# Altium footprint library DIP Component.PcbLib: 327 footprints (part 5 of 21)
Each footprint in its own frame and in the unit in brackets; x right, y up, seen from the top. Pads: shape width x height; smd on the part's side, far side on the other; paste and mask are expansions set on the pad; w line width, h text height; cw(c..) or ccw(c..) is an arc to the next point about the centre after c.
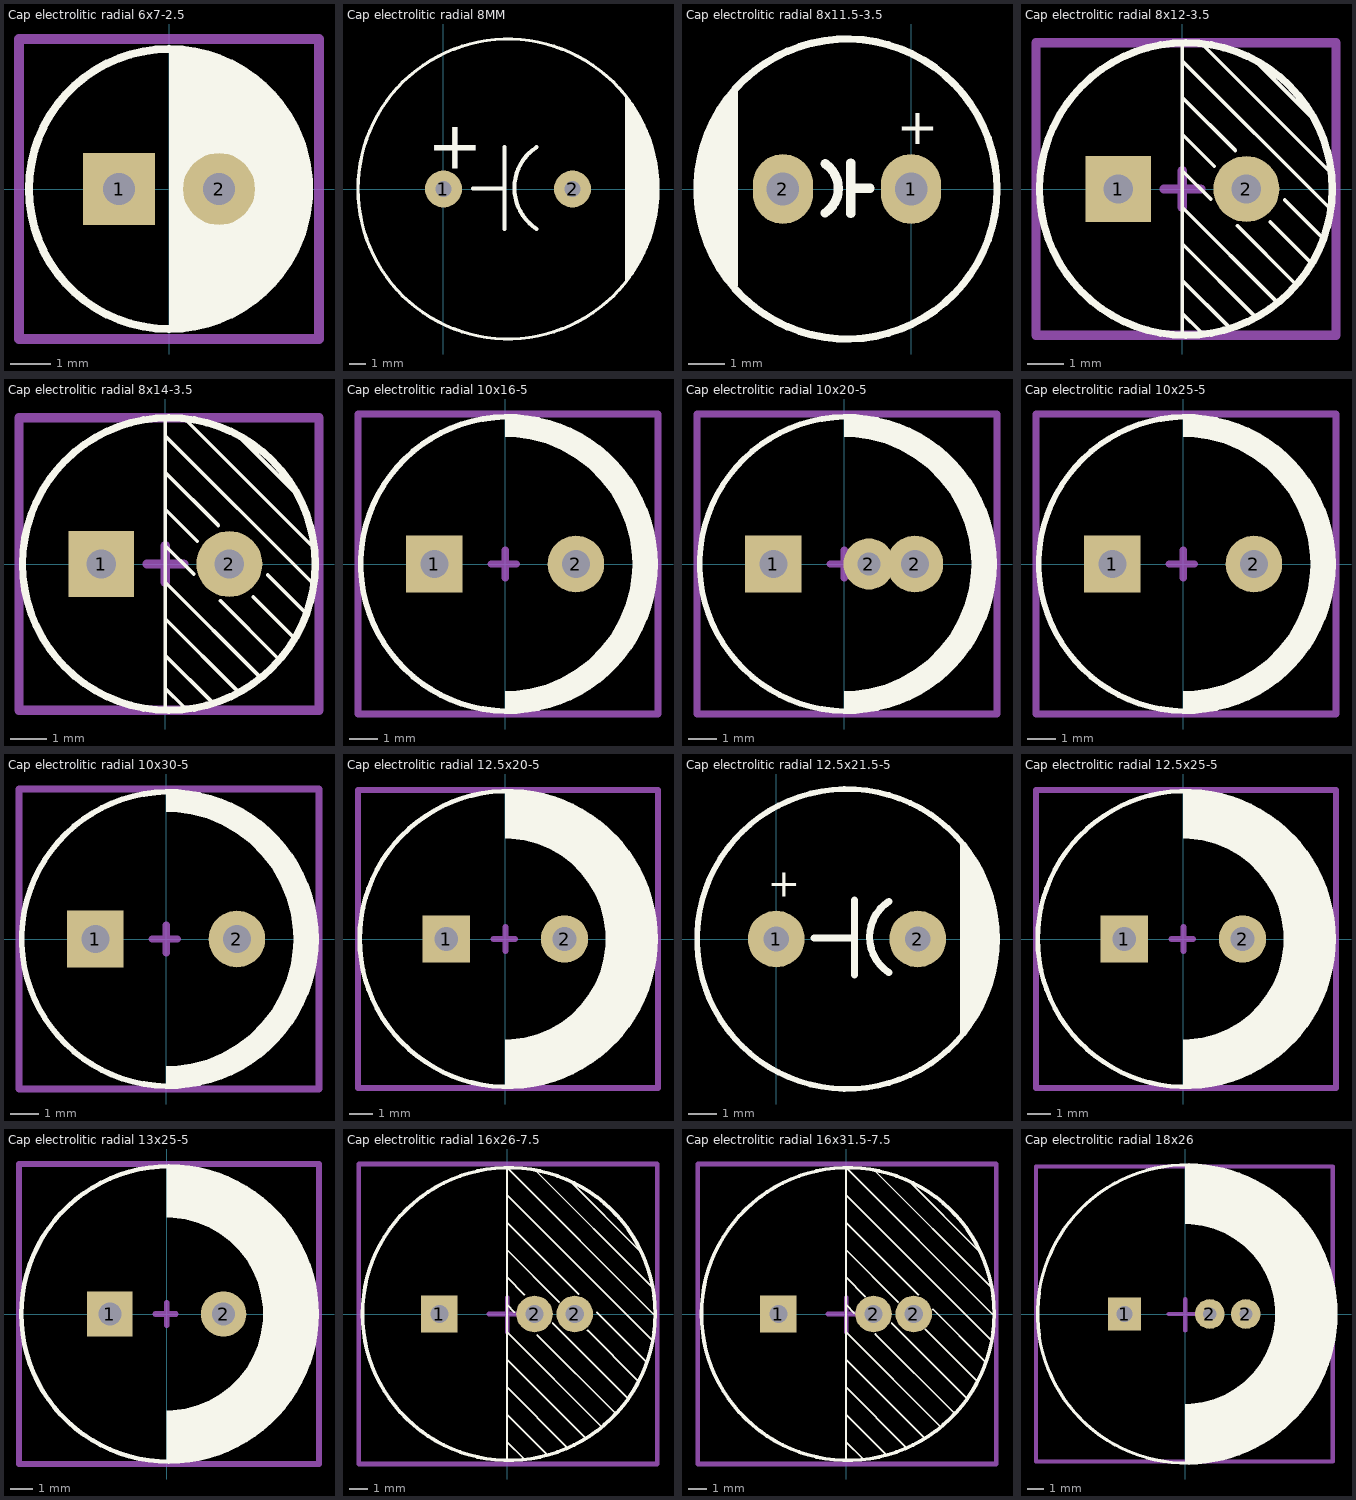
[diagram p4: the footprints below, top view; thin cyan lines are the x and y axes]

## Cap electrolitic radial 6x7-2.5 [mm] "Cap electrolitic radial 6x7-2.5-Design:Abbas Basereh"
height 7
pads (2):
  rect 1.8x1.8 hole 0.8: 1(-1.25,0)
  round 1.8 hole 0.8: 2(1.25,0)
Top Overlay:
  circle w0.2: c0,0 r3.5
  region: 0,3.5 0.096,3.5 0.325,3.5 0.78,3.44 1.223,3.321 1.647,3.146 2.045,2.916 2.409,2.637 2.733,2.313 3.012,1.949 3.242,1.551 3.417,1.127 3.536,0.684 3.596,0.229 3.596,0 3.596,-0.229 3.536,-0.684 3.417,-1.127 3.242,-1.551 3.012,-1.949 2.733,-2.313 2.409,-2.637 2.045,-2.916 1.647,-3.146 1.223,-3.321 0.78,-3.44 0.325,-3.5 0.096,-3.5 0,-3.5
Mechanical 15:
  lines w0.254: -3.75,-3.75 3.75,-3.75 3.75,3.75 -3.75,3.75 -3.75,-3.75
3D body "User Library-Cap electrolitic radial 6x7.STEP": height 7.3, standoff -1.2, extent -2.999,-2.999 2.999,2.998

## Cap electrolitic radial 8MM [mil] "Cap electrolitic radial 8MM-Design:Ali Hafizi"
pads (2):
  round 90 hole 39.37: 1(0,0) 2(314.96,0)
Top Overlay:
  circle w7.87: c157.48,0 r366.14
  lines w7.87: 446.46,-223.23 446.46,223.23 ; 453.54,-212.6 453.54,212.6 ; 460.63,-205.51 460.63,205.51 ; 467.72,-191.34 467.72,194.88 ; 474.8,-180.71 474.8,180.71 ; 481.89,-170.08 481.89,166.54 ; 488.98,-155.91 488.98,155.91 ; 496.06,-138.19 496.06,138.19 ; 503.15,-120.47 503.15,120.47 ; 510.24,-95.67 510.24,95.67 ; 517.32,-67.32 517.32,67.32
  lines w10: 72.44,1.57 148.82,1.57 ; 148.82,-97.64 148.82,102.36 ; 226.77,-97.24 cw(c292.4,2.29) 227.37,102.22
  text "+" at -39.37,49.61 h118.11

## Cap electrolitic radial 8x11.5-3.5 [mil] "Cap electrolitic radial 8x11.5-3.5-Design:Ali Hafizi"
pads (2):
  oval 65x75 hole 35: 1(0,0) 2(-137.8,0)
Top Overlay:
  circle w7.87: c-68.9,0 r161.42
  lines w7.87: -222.56,-42.13 -222.56,43.7
  lines w10: -215.08,-64.17 -215.08,63.78 ; -206.42,-81.89 -206.42,81.5 ; -197.76,-94.88 -197.76,95.28 ; -191.06,-103.15 -191.06,103.94 ; -92.54,-25.8 ccw(c-109.77,0.68) -92.38,27.05 ; -64.96,-26.38 -64.96,27.95 ; -64.96,0.79 -44.09,0.79
  text "+" at -15.35,48.03 h39.37
3D body "SW3dPS-Cap electro 8x11.5x3.5mm_V2008.STEP": height 473.44, standoff -136.91, extent -228.38,-159 88.58,157.96

## Cap electrolitic radial 8x12-3.5 [mm] "Cap electrolitic radial 8x12-3.5-Design:Abbas Basereh"
height 12
pads (2):
  rect 1.8x1.8 hole 0.8: 1(-1.75,0)
  round 1.8 hole 0.8: 2(1.75,0)
Top Overlay:
  circle w0.2: c0.096,0 r4
  lines w0.1: 0,-4 0,4 ; 0,-3.4 0.5,-3.9 ; 0,-2.5 1.3,-3.8 ; 0,-1.5 2,-3.5 ; 0,-0.5 2.6,-3.1 ; 0,0.5 0.775,-0.275 ; 0,1.5 0.875,0.625 ; 0,2.5 1.45,1.05 ; 0,3.5 4,-0.5 ; 0.5,4 4,0.5 ; 1.5,-1 3.1,-2.6 ; 2,3.5 3.6,1.9 ; 2.4,-0.9 3.5,-2 ; 2.8,-0.3 3.8,-1.3
Mechanical 15:
  lines w0.254: -0.5,0 0.5,0 ; 0,-0.5 0,0.5 ; -4,-4 -4,4 4.2,4 4.2,-4 -4,-4
3D body "User Library-Cap-EL(8x12-3_5)T.STEP": height 12.3, standoff -3.3, extent -4,-3.998 4.002,3.998

## Cap electrolitic radial 8x14-3.5 [mm] "Cap electrolitic radial 8x14-3.5-Design:Abbas Basereh"
height 14
pads (2):
  rect 1.8x1.8 hole 0.8: 1(-1.75,0)
  round 1.8 hole 0.8: 2(1.75,0)
Top Overlay:
  circle w0.2: c0.096,0 r4
  lines w0.1: 0,-4 0,4 ; 0,-3.4 0.5,-3.9 ; 0,-2.5 1.3,-3.8 ; 0,-1.5 2,-3.5 ; 0,-0.5 2.6,-3.1 ; 0,0.5 0.775,-0.275 ; 0,1.5 0.875,0.625 ; 0,2.5 1.45,1.05 ; 0,3.5 4,-0.5 ; 0.5,4 4,0.5 ; 1.5,-1 3.1,-2.6 ; 2,3.5 3.6,1.9 ; 2.4,-0.9 3.5,-2 ; 2.8,-0.3 3.8,-1.3
Mechanical 15:
  lines w0.254: -0.5,0 0.5,0 ; 0,-0.5 0,0.5 ; -4,-4 4.2,-4 4.2,4 -4,4 -4,-4
3D body "User Library-CAP-EL8X14_R150_D320_H570.STEP": height 14.6, standoff -2.7, extent -4.1,-4.1 4.1,4.1

## Cap electrolitic radial 10x16-5 [mm] "Cap electrolitic radial 10x16-5-Design:Abbas Basereh"
height 16
pads (2):
  rect 2x2 hole 1: 1(-2.5,0)
  round 2 hole 1: 2(2.5,0)
Top Overlay:
  circle w0.2: c0.096,0 r5.2
  region: 0,5.2 0.096,5.2 0.437,5.2 1.113,5.111 1.771,4.935 2.401,4.674 2.991,4.333 3.532,3.918 4.014,3.436 4.429,2.895 4.77,2.305 5.031,1.675 5.207,1.017 5.296,0.341 5.296,0 5.296,-0.341 5.207,-1.017 5.031,-1.675 4.77,-2.305 4.429,-2.895 4.014,-3.436 3.532,-3.918 2.991,-4.333 2.401,-4.674 1.771,-4.935 1.113,-5.111 0.437,-5.2 0.096,-5.2 0,-5.2 0,-4.5 0.294,-4.49 0.878,-4.414 1.446,-4.261 1.99,-4.036 2.5,-3.742 2.967,-3.383 3.383,-2.967 3.742,-2.5 4.036,-1.99 4.261,-1.446 4.414,-0.878 4.49,-0.294 4.5,0 4.49,0.294 4.414,0.878 4.261,1.446 4.036,1.99 3.742,2.5 3.383,2.967 2.967,3.383 2.5,3.742 1.99,4.036 1.446,4.261 0.878,4.414 0.294,4.49 0,4.5
Mechanical 15:
  lines w0.254: -0.5,0 0.4,0 ; 0,-0.5 0,0.5 ; -5.2,-5.3 -5.2,5.3 5.4,5.3 5.4,-5.3 -5.2,-5.3
3D body "User Library-Cap-EL(10x16-5).STEP": height 16, standoff -3.3, extent -5,-4.997 5.002,4.998

## Cap electrolitic radial 10x20-5 [mm] "Cap electrolitic radial 10x20-5-Design:Abbas Basereh"
height 20
pads (3):
  rect 2x2 hole 1: 1(-2.5,0)
  round 1.8 hole 0.8: 2(0.875,0)
  round 2 hole 1: 2(2.5,0)
Top Overlay:
  circle w0.2: c0.096,0 r5.2
  region: 0,5.2 0.096,5.2 0.437,5.2 1.113,5.111 1.771,4.935 2.401,4.674 2.991,4.333 3.532,3.918 4.014,3.436 4.429,2.895 4.77,2.305 5.031,1.675 5.207,1.017 5.296,0.341 5.296,0 5.296,-0.341 5.207,-1.017 5.031,-1.675 4.77,-2.305 4.429,-2.895 4.014,-3.436 3.532,-3.918 2.991,-4.333 2.401,-4.674 1.771,-4.935 1.113,-5.111 0.437,-5.2 0.096,-5.2 0,-5.2 0,-4.5 0.294,-4.49 0.878,-4.414 1.446,-4.261 1.99,-4.036 2.5,-3.742 2.967,-3.383 3.383,-2.967 3.742,-2.5 4.036,-1.99 4.261,-1.446 4.414,-0.878 4.49,-0.294 4.5,0 4.49,0.294 4.414,0.878 4.261,1.446 4.036,1.99 3.742,2.5 3.383,2.967 2.967,3.383 2.5,3.742 1.99,4.036 1.446,4.261 0.878,4.414 0.294,4.49 0,4.5
Mechanical 15:
  lines w0.254: -0.5,0 0.4,0 ; 0,-0.5 0,0.5 ; -5.2,-5.3 -5.2,5.3 5.4,5.3 5.4,-5.3 -5.2,-5.3
3D body "User Library-Cap-EL(10x20-5).STEP": height 20, standoff -3.3, extent -5,-5 5.002,5

## Cap electrolitic radial 10x25-5 [mm] "Cap electrolitic radial 10x25-5-Design:Abbas Basereh"
height 25
pads (2):
  rect 2x2 hole 1: 1(-2.5,0)
  round 2 hole 1: 2(2.5,0)
Top Overlay:
  circle w0.2: c0.096,0 r5.2
  region: 0,5.2 0.096,5.2 0.437,5.2 1.113,5.111 1.771,4.935 2.401,4.674 2.991,4.333 3.532,3.918 4.014,3.436 4.429,2.895 4.77,2.305 5.031,1.675 5.207,1.017 5.296,0.341 5.296,0 5.296,-0.341 5.207,-1.017 5.031,-1.675 4.77,-2.305 4.429,-2.895 4.014,-3.436 3.532,-3.918 2.991,-4.333 2.401,-4.674 1.771,-4.935 1.113,-5.111 0.437,-5.2 0.096,-5.2 0,-5.2 0,-4.5 0.294,-4.49 0.878,-4.414 1.446,-4.261 1.99,-4.036 2.5,-3.742 2.967,-3.383 3.383,-2.967 3.742,-2.5 4.036,-1.99 4.261,-1.446 4.414,-0.878 4.49,-0.294 4.5,0 4.49,0.294 4.414,0.878 4.261,1.446 4.036,1.99 3.742,2.5 3.383,2.967 2.967,3.383 2.5,3.742 1.99,4.036 1.446,4.261 0.878,4.414 0.294,4.49 0,4.5
Mechanical 15:
  lines w0.254: -0.5,0 0.4,0 ; 0,-0.5 0,0.5 ; -5.2,-5.3 5.4,-5.3 5.4,5.3 -5.2,5.3 -5.2,-5.3
3D body "User Library-Cap-EL(10x25-5).STEP": height 25, standoff -3.3, extent -5,-4.998 5.002,4.999

## Cap electrolitic radial 10x30-5 [mm] "Cap electrolitic radial 10x30-5-Design:Abbas Basereh"
height 30
pads (2):
  rect 2x2 hole 1: 1(-2.5,0)
  round 2 hole 1: 2(2.5,0)
Top Overlay:
  circle w0.2: c0.096,0 r5.2
  region: 0,5.2 0.096,5.2 0.437,5.2 1.113,5.111 1.771,4.935 2.401,4.674 2.991,4.333 3.532,3.918 4.014,3.436 4.429,2.895 4.77,2.305 5.031,1.675 5.207,1.017 5.296,0.341 5.296,0 5.296,-0.341 5.207,-1.017 5.031,-1.675 4.77,-2.305 4.429,-2.895 4.014,-3.436 3.532,-3.918 2.991,-4.333 2.401,-4.674 1.771,-4.935 1.113,-5.111 0.437,-5.2 0.096,-5.2 0,-5.2 0,-4.5 0.294,-4.49 0.878,-4.414 1.446,-4.261 1.99,-4.036 2.5,-3.742 2.967,-3.383 3.383,-2.967 3.742,-2.5 4.036,-1.99 4.261,-1.446 4.414,-0.878 4.49,-0.294 4.5,0 4.49,0.294 4.414,0.878 4.261,1.446 4.036,1.99 3.742,2.5 3.383,2.967 2.967,3.383 2.5,3.742 1.99,4.036 1.446,4.261 0.878,4.414 0.294,4.49 0,4.5
Mechanical 15:
  lines w0.254: -0.5,0 0.4,0 ; 0,-0.5 0,0.5 ; -5.2,-5.3 5.4,-5.3 5.4,5.3 -5.2,5.3 -5.2,-5.3
3D body "User Library-Cap-EL(10x30-5)T.STEP": height 30.5, standoff -3.5, extent -5,-4.997 5.002,4.996

## Cap electrolitic radial 12.5x20-5 [mm] "Cap electrolitic radial 12.5x20-5-Design:Abbas Basereh"
height 20
pads (2):
  rect 2x2 hole 1: 1(-2.5,0)
  round 2 hole 1: 2(2.5,0)
Top Overlay:
  circle w0.2: c0.096,0 r6.25
  region: 0,6.25 0.307,6.25 0.918,6.19 1.52,6.07 2.108,5.892 2.675,5.657 3.217,5.367 3.728,5.026 4.202,4.637 4.637,4.202 5.026,3.728 5.367,3.217 5.657,2.675 5.892,2.108 6.07,1.52 6.19,0.918 6.25,0.307 6.25,0 6.25,-0.307 6.19,-0.918 6.07,-1.52 5.892,-2.108 5.657,-2.675 5.367,-3.217 5.026,-3.728 4.637,-4.202 4.202,-4.637 3.728,-5.026 3.217,-5.367 2.675,-5.657 2.108,-5.892 1.52,-6.07 0.918,-6.19 0.307,-6.25 0,-6.25 0,-4.25 0.278,-4.241 0.829,-4.168 1.366,-4.024 1.88,-3.812 2.361,-3.534 2.802,-3.195 3.195,-2.802 3.534,-2.361 3.812,-1.88 4.024,-1.366 4.168,-0.829 4.241,-0.278 4.25,0 4.241,0.278 4.168,0.829 4.024,1.366 3.812,1.88 3.534,2.361 3.195,2.802 2.802,3.195 2.361,3.534 1.88,3.812 1.366,4.024 0.829,4.168 0.278,4.241 0,4.25
Mechanical 15:
  lines w0.254: -0.5,0 0.4,0 ; 0,-0.5 0,0.5 ; -6.225,-6.3 6.45,-6.3 6.45,6.3 -6.225,6.3 -6.225,-6.3
3D body "User Library-Cap-EL(12_5x20-5)T.STEP": height 20.7, standoff -3.3, extent -6.25,-6.25 6.252,6.25

## Cap electrolitic radial 12.5x21.5-5 [mm] "Cap electrolitic radial 12.5x21.5-5-Design:Ali Hafizi"
pads (2):
  round 2 hole 0.9: 1(0,0) 2(5,0)
Top Overlay:
  circle w0.2: c2.5,0 r5.3
  lines w0.2: 6.6,-3.3 6.6,3.3 ; 6.8,-3.1 6.8,3.1 ; 7,-2.8 7,2.8 ; 7.2,-2.4 7.2,2.4 ; 7.4,-2 7.4,2 ; 7.6,-1.4 7.6,1.5
  lines w0.254: 1.34,0.04 2.76,0.04 ; 2.76,-1.27 2.76,1.37 ; 3.972,-1.18 cw(c4.798,0.073) 3.98,1.33
  text "+" at -0.3,1.5 h1
3D body "SW3dPS-Cap electro 10x12.5x5.0mm.STEP": height 13.03, standoff -3.48, extent -2.542,-4.984 7.509,5.067

## Cap electrolitic radial 12.5x25-5 [mm] "Cap electrolitic radial 12.5x25-5-Design:Abbas Basereh"
height 25
pads (2):
  rect 2x2 hole 1: 1(-2.5,0)
  round 2 hole 1: 2(2.5,0)
Top Overlay:
  circle w0.2: c0.096,0 r6.25
  region: 0,6.25 0.307,6.25 0.918,6.19 1.52,6.07 2.108,5.892 2.675,5.657 3.217,5.367 3.728,5.026 4.202,4.637 4.637,4.202 5.026,3.728 5.367,3.217 5.657,2.675 5.892,2.108 6.07,1.52 6.19,0.918 6.25,0.307 6.25,0 6.25,-0.307 6.19,-0.918 6.07,-1.52 5.892,-2.108 5.657,-2.675 5.367,-3.217 5.026,-3.728 4.637,-4.202 4.202,-4.637 3.728,-5.026 3.217,-5.367 2.675,-5.657 2.108,-5.892 1.52,-6.07 0.918,-6.19 0.307,-6.25 0,-6.25 0,-4.25 0.278,-4.241 0.829,-4.168 1.366,-4.024 1.88,-3.812 2.361,-3.534 2.802,-3.195 3.195,-2.802 3.534,-2.361 3.812,-1.88 4.024,-1.366 4.168,-0.829 4.241,-0.278 4.25,0 4.241,0.278 4.168,0.829 4.024,1.366 3.812,1.88 3.534,2.361 3.195,2.802 2.802,3.195 2.361,3.534 1.88,3.812 1.366,4.024 0.829,4.168 0.278,4.241 0,4.25
Mechanical 15:
  lines w0.254: -0.5,0 0.4,0 ; 0,-0.5 0,0.5 ; -6.225,-6.3 6.45,-6.3 6.45,6.3 -6.225,6.3 -6.225,-6.3
3D body "User Library-Cap-EL(12_5x25-5)T.STEP": height 25.7, standoff -3.3, extent -6.25,-6.25 6.252,6.25

## Cap electrolitic radial 13x25-5 [mm] "Cap electrolitic radial 13x25-5-Design:Abbas Basereh"
height 25
pads (2):
  rect 2x2 hole 1: 1(-2.5,0)
  round 2 hole 1: 2(2.5,0)
Top Overlay:
  circle w0.2: c0.096,0 r6.5
  region: 0,6.5 0.096,6.5 0.415,6.5 1.051,6.437 1.677,6.313 2.288,6.127 2.878,5.883 3.442,5.582 3.973,5.227 4.466,4.822 4.918,4.37 5.323,3.877 5.678,3.346 5.979,2.782 6.223,2.192 6.409,1.581 6.533,0.955 6.596,0.319 6.596,0 6.596,-0.319 6.533,-0.955 6.409,-1.581 6.223,-2.192 5.979,-2.782 5.678,-3.346 5.323,-3.877 4.918,-4.37 4.466,-4.822 3.973,-5.227 3.442,-5.582 2.878,-5.883 2.288,-6.127 1.677,-6.313 1.051,-6.437 0.415,-6.5 0.096,-6.5 0,-6.5 0,-4.25 0.278,-4.241 0.829,-4.168 1.366,-4.024 1.88,-3.812 2.361,-3.534 2.802,-3.195 3.195,-2.802 3.534,-2.361 3.812,-1.88 4.024,-1.366 4.168,-0.829 4.241,-0.278 4.25,0 4.241,0.278 4.168,0.829 4.024,1.366 3.812,1.88 3.534,2.361 3.195,2.802 2.802,3.195 2.361,3.534 1.88,3.812 1.366,4.024 0.829,4.168 0.278,4.241 0,4.25
Mechanical 15:
  lines w0.254: -0.5,0 0.4,0 ; 0,-0.5 0,0.5 ; -6.5,-6.6 6.7,-6.6 6.7,6.6 -6.5,6.6 -6.5,-6.6
3D body "User Library-Cap-EL(13x25-5).STEP": height 25.2, standoff -3.1, extent -6.5,-6.499 6.502,6.499

## Cap electrolitic radial 16x26-7.5 [mm] "Cap electrolitic radial 16x26-7.5-Design:Abbas Basereh"
height 26
pads (3):
  rect 2x2 hole 1: 1(-3.7,0)
  round 2 hole 1: 2(1.5,0) 2(3.7,0)
Top Overlay:
  circle w0.2: c0.096,0 r8
  lines w0.1: 0,-8 0,8 8,0 ; 0,-7 0.9,-7.9 ; 0,-5.5 2.2,-7.7 ; 0,-4 3.3,-7.3 ; 0,-2.5 4.3,-6.8 ; 0,-1 5.15,-6.15 ; 0,0.5 0.4,0.1 ; 0,2 0.95,1.05 ; 0,3.5 2.85,0.65 ; 0,5 3.9,1.1 ; 0,6.5 7.9,-1.4 ; 1.5,7.9 7.9,1.5 ; 1.65,-1.15 5.9,-5.4 ; 2.5,-0.5 6.6,-4.6 ; 3.5,7.2 7.2,3.5 ; 4.4,-0.9 7.2,-3.7 ; 4.9,0.1 7.6,-2.6 ; 0.9,-7.9 0.9,-7.9
Mechanical 15:
  lines w0.254: -1,0 1,0 ; 0,-1 0,0.9 ; -8.1,-8.2 8.2,-8.2 8.2,8.2 -8.1,8.2 -8.1,-8.2
3D body "User Library-Cap-EL(16x26-7_5).STEP": height 26.2, standoff -4.1, extent -8,-7.997 8.002,7.997

## Cap electrolitic radial 16x31.5-7.5 [mm] "Cap electrolitic radial 16x31.5-7.5-Design:Abbas Basereh"
height 31.5
pads (3):
  rect 2x2 hole 1: 1(-3.7,0)
  round 2 hole 1: 2(1.5,0) 2(3.7,0)
Top Overlay:
  circle w0.2: c0.096,0 r8
  lines w0.1: 0,-8 0,8 8,0 ; 0,-7 0.9,-7.9 ; 0,-5.5 2.2,-7.7 ; 0,-4 3.3,-7.3 ; 0,-2.5 4.3,-6.8 ; 0,-1 5.15,-6.15 ; 0,0.5 0.45,0.05 ; 0,2 1.05,0.95 ; 0,3.5 2.85,0.65 ; 0,5 3.95,1.05 ; 0,6.5 7.9,-1.4 ; 1.5,7.9 7.9,1.5 ; 1.6,-1.1 5.9,-5.4 ; 2.5,-0.5 6.6,-4.6 ; 3.5,7.2 7.2,3.5 ; 4.35,-0.85 7.2,-3.7 ; 4.75,0.25 7.6,-2.6 ; 0.9,-7.9 0.9,-7.9
Mechanical 15:
  lines w0.254: -1,0 1,0 ; 0,-1 0,0.9 ; -8.1,-8.2 8.2,-8.2 8.2,8.2 -8.1,8.2 -8.1,-8.2
3D body "User Library-Cap-EL(16x31_5-7_5)T.STEP": height 41.2, standoff -2.8, extent -8,-8 8.002,8

## Cap electrolitic radial 18x26 [mm] "Cap electrolitic radial 18x26-Design:Abbas Basereh"
height 26
pads (3):
  rect 2x2 hole 1: 1(-3.7,0)
  round 1.8 hole 0.8: 2(1.5,0) 2(3.7,0)
Top Overlay:
  circle w0.2: c0.096,0 r9.1
  region: 0,9.1 0.096,9.1 0.543,9.1 1.433,9.012 2.31,8.838 3.165,8.578 3.991,8.236 4.78,7.815 5.523,7.318 6.215,6.751 6.847,6.119 7.414,5.427 7.911,4.684 8.332,3.895 8.674,3.069 8.934,2.214 9.108,1.337 9.196,0.447 9.196,0 9.196,-0.447 9.108,-1.337 8.934,-2.214 8.674,-3.069 8.332,-3.895 7.911,-4.684 7.414,-5.427 6.847,-6.119 6.215,-6.751 5.523,-7.318 4.78,-7.815 3.991,-8.236 3.165,-8.578 2.31,-8.838 1.433,-9.012 0.543,-9.1 0.096,-9.1 0,-9.1 0,-5.5 0.36,-5.488 1.073,-5.394 1.768,-5.208 2.433,-4.933 3.056,-4.573 3.626,-4.135 4.135,-3.626 4.573,-3.056 4.933,-2.433 5.208,-1.768 5.394,-1.073 5.488,-0.36 5.5,0 5.488,0.36 5.394,1.073 5.208,1.768 4.933,2.433 4.573,3.056 4.135,3.626 3.626,4.135 3.056,4.573 2.433,4.933 1.768,5.208 1.073,5.394 0.36,5.488 0,5.5
Mechanical 15:
  lines w0.254: -1,0 1,0 ; 0,-1 0,0.9 ; -9.1,-9 -9.1,9 9,9 9,-9 -9.1,-9
3D body "User Library-Cap-EL(18x26-7_5)T.STEP": height 27, standoff -3, extent -9,-8.999 9.002,8.999